# Altium footprint library tinyCLUNX33.PcbLib: 4 footprints
Each footprint in its own frame and in the unit in brackets; x right, y up, seen from the top. Pads: shape width x height; smd on the part's side, far side on the other; paste and mask are expansions set on the pad; w line width, h text height; cw(c..) or ccw(c..) is an arc to the next point about the centre after c.
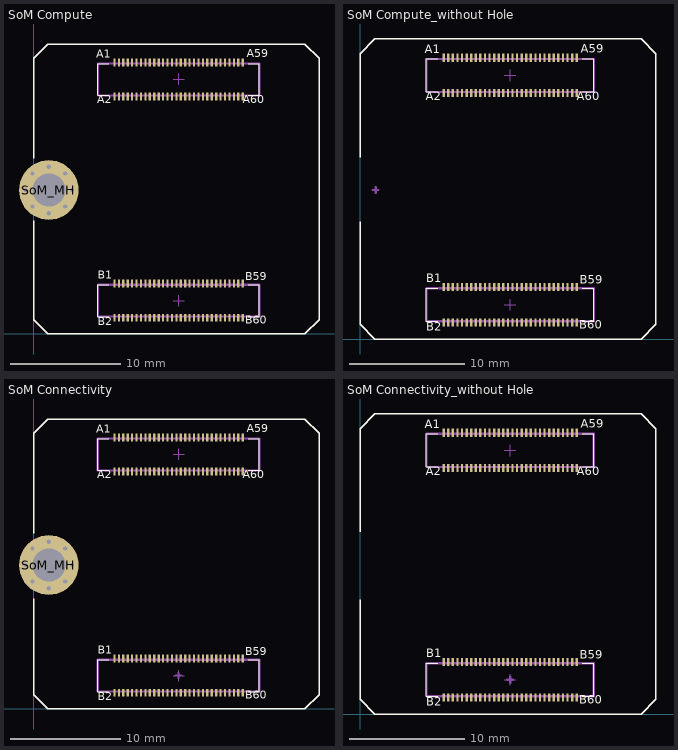
[diagram p0: the footprints below, top view; thin cyan lines are the x and y axes]

## SoM Compute [mm]
pads (121):
  rect 0.2x0.7 smd mask+0.051: A1(7.282,24.527) A2(7.282,21.447) A3(7.682,24.527) A4(7.682,21.447) A5(8.082,24.527) A6(8.082,21.447) A7(8.482,24.527) A8(8.482,21.447) A9(8.882,24.527) A10(8.882,21.447) A11(9.282,24.527) A12(9.282,21.447) A13(9.682,24.527) A14(9.682,21.447) A15(10.082,24.527) A16(10.082,21.447) A17(10.482,24.527) A18(10.482,21.447) A19(10.882,24.527) A20(10.882,21.447) A21(11.282,24.527) A22(11.282,21.447) A23(11.682,24.527) A24(11.682,21.447) A25(12.082,24.527) A26(12.082,21.447) A27(12.482,24.527) A28(12.482,21.447) A29(12.882,24.527) A30(12.882,21.447) A31(13.282,24.527) A32(13.282,21.447) A33(13.682,24.527) A34(13.682,21.447) A35(14.082,24.527) A36(14.082,21.447) A37(14.482,24.527) A38(14.482,21.447) A39(14.882,24.527) A40(14.882,21.447) A41(15.282,24.527) A42(15.282,21.447) A43(15.682,24.527) A44(15.682,21.447) A45(16.082,24.527) A46(16.082,21.447) A47(16.482,24.527) A48(16.482,21.447) A49(16.882,24.527) A50(16.882,21.447) A51(17.282,24.527) A52(17.282,21.447) A53(17.682,24.527) A54(17.682,21.447) A55(18.082,24.527) A56(18.082,21.447) A57(18.482,24.527) A58(18.482,21.447) A59(18.882,24.527) A60(18.882,21.447) B1(7.282,4.527) B2(7.282,1.447) B3(7.682,4.527) B4(7.682,1.447) B5(8.082,4.527) B6(8.082,1.447) B7(8.482,4.527) B8(8.482,1.447) B9(8.882,4.527) B10(8.882,1.447) B11(9.282,4.527) B12(9.282,1.447) B13(9.682,4.527) B14(9.682,1.447) B15(10.082,4.527) B16(10.082,1.447) B17(10.482,4.527) B18(10.482,1.447) B19(10.882,4.527) B20(10.882,1.447) B21(11.282,4.527) B22(11.282,1.447) B23(11.682,4.527) B24(11.682,1.447) B25(12.082,4.527) B26(12.082,1.447) B27(12.482,4.527) B28(12.482,1.447) B29(12.882,4.527) B30(12.882,1.447) B31(13.282,4.527) B32(13.282,1.447) B33(13.682,4.527) B34(13.682,1.447) B35(14.082,4.527) B36(14.082,1.447) B37(14.482,4.527) B38(14.482,1.447) B39(14.882,4.527) B40(14.882,1.447) B41(15.282,4.527) B42(15.282,1.447) B43(15.682,4.527) B44(15.682,1.447) B45(16.082,4.527) B46(16.082,1.447) B47(16.482,4.527) B48(16.482,1.447) B49(16.882,4.527) B50(16.882,1.447) B51(17.282,4.527) B52(17.282,1.447) B53(17.682,4.527) B54(17.682,1.447) B55(18.082,4.527) B56(18.082,1.447) B57(18.482,4.527) B58(18.482,1.447) B59(18.882,4.527) B60(18.882,1.447)
  round 5.4 hole 3: SoM_MH(1.35,12.987)
via 2.835,11.502 diameter 0.762 hole 0.381
via -0.135,11.502 diameter 0.762 hole 0.381
via 1.35,10.887 diameter 0.762 hole 0.381
via -0.135,14.472 diameter 0.762 hole 0.381
via -0.75,12.987 diameter 0.762 hole 0.381
via 1.35,15.087 diameter 0.762 hole 0.381
via 2.835,14.472 diameter 0.762 hole 0.381
via 3.45,12.987 diameter 0.762 hole 0.381
Top Overlay:
  lines w0.1: 6.782,1.547 5.782,1.547 5.782,4.427 6.782,4.427 ; 6.782,21.547 5.782,21.547 5.782,24.427 6.782,24.427 ; 19.382,1.547 20.382,1.547 20.382,4.427 19.382,4.427 ; 19.382,21.547 20.382,21.547 20.382,24.427 19.382,24.427
  lines w0.127: 0,1.27 0,10.21 ; 0,15.851 0,24.892 1.27,26.162 24.511,26.162 25.781,24.892 25.781,1.27 24.511,0 1.27,0 0.001,1.27
  text "B1" at 5.782,4.677 h1.27
  text "B2" at 5.782,0.473 h1.27
  text "B60" at 19.101,0.623 h1.27
  text "B59" at 19.126,4.562 h1.27
  text "A1" at 5.626,24.677 h1.27
  text "A2" at 5.716,20.549 h1.27
  text "A60" at 18.883,20.562 h1.27
  text "A59" at 19.229,24.704 h1.27
Mechanical 1:
  lines w0.051: 12.582,2.987 13.582,2.987 ; 12.582,22.987 13.582,22.987 ; 13.082,2.487 13.082,3.487 ; 13.082,22.487 13.082,23.487
  lines w0.2: 1.096,12.987 1.604,12.987 ; 1.35,12.733 1.35,13.241
Mechanical 13:
  lines w0.2: 5.782,1.547 5.782,4.427 20.382,4.427 20.382,1.547 5.782,1.547 ; 5.782,21.547 5.782,24.427 20.382,24.427 20.382,21.547 5.782,21.547
  text "B59" at 18.364,3.444 h1.27
  text "B60" at 18.364,1.766 h1.27
  text "B2" at 5.993,1.775 h1.27
  text "B1" at 6.017,3.403 h1.27
  text ".Designator" at 12.367,12.721 h0.3
  text "A59" at 18.238,23.434 h1.27
  text "A60" at 18.213,21.882 h1.27
  text "A2" at 6.021,21.819 h1.27
  text "A1" at 6.021,23.444 h1.27
3D body "DF40C(2.0)-60DS.stp": height 1.96, standoff 0.01, extent 5.782,1.297 20.382,4.677
3D body "DF40C(2.0)-60DS.stp": height 1.96, standoff 0.01, extent 5.782,21.297 20.382,24.677
3D body "tinyNXU_Compute v3.0.step": height 4.4, standoff 0.84, extent 0,0 25.781,26.162

## SoM Compute_without Hole [mm]
pads (120):
  rect 0.2x0.7 smd mask+0.051: A1(7.282,24.527) A2(7.282,21.447) A3(7.682,24.527) A4(7.682,21.447) A5(8.082,24.527) A6(8.082,21.447) A7(8.482,24.527) A8(8.482,21.447) A9(8.882,24.527) A10(8.882,21.447) A11(9.282,24.527) A12(9.282,21.447) A13(9.682,24.527) A14(9.682,21.447) A15(10.082,24.527) A16(10.082,21.447) A17(10.482,24.527) A18(10.482,21.447) A19(10.882,24.527) A20(10.882,21.447) A21(11.282,24.527) A22(11.282,21.447) A23(11.682,24.527) A24(11.682,21.447) A25(12.082,24.527) A26(12.082,21.447) A27(12.482,24.527) A28(12.482,21.447) A29(12.882,24.527) A30(12.882,21.447) A31(13.282,24.527) A32(13.282,21.447) A33(13.682,24.527) A34(13.682,21.447) A35(14.082,24.527) A36(14.082,21.447) A37(14.482,24.527) A38(14.482,21.447) A39(14.882,24.527) A40(14.882,21.447) A41(15.282,24.527) A42(15.282,21.447) A43(15.682,24.527) A44(15.682,21.447) A45(16.082,24.527) A46(16.082,21.447) A47(16.482,24.527) A48(16.482,21.447) A49(16.882,24.527) A50(16.882,21.447) A51(17.282,24.527) A52(17.282,21.447) A53(17.682,24.527) A54(17.682,21.447) A55(18.082,24.527) A56(18.082,21.447) A57(18.482,24.527) A58(18.482,21.447) A59(18.882,24.527) A60(18.882,21.447) B1(7.282,4.527) B2(7.282,1.447) B3(7.682,4.527) B4(7.682,1.447) B5(8.082,4.527) B6(8.082,1.447) B7(8.482,4.527) B8(8.482,1.447) B9(8.882,4.527) B10(8.882,1.447) B11(9.282,4.527) B12(9.282,1.447) B13(9.682,4.527) B14(9.682,1.447) B15(10.082,4.527) B16(10.082,1.447) B17(10.482,4.527) B18(10.482,1.447) B19(10.882,4.527) B20(10.882,1.447) B21(11.282,4.527) B22(11.282,1.447) B23(11.682,4.527) B24(11.682,1.447) B25(12.082,4.527) B26(12.082,1.447) B27(12.482,4.527) B28(12.482,1.447) B29(12.882,4.527) B30(12.882,1.447) B31(13.282,4.527) B32(13.282,1.447) B33(13.682,4.527) B34(13.682,1.447) B35(14.082,4.527) B36(14.082,1.447) B37(14.482,4.527) B38(14.482,1.447) B39(14.882,4.527) B40(14.882,1.447) B41(15.282,4.527) B42(15.282,1.447) B43(15.682,4.527) B44(15.682,1.447) B45(16.082,4.527) B46(16.082,1.447) B47(16.482,4.527) B48(16.482,1.447) B49(16.882,4.527) B50(16.882,1.447) B51(17.282,4.527) B52(17.282,1.447) B53(17.682,4.527) B54(17.682,1.447) B55(18.082,4.527) B56(18.082,1.447) B57(18.482,4.527) B58(18.482,1.447) B59(18.882,4.527) B60(18.882,1.447)
Top Overlay:
  lines w0.1: 6.782,1.547 5.782,1.547 5.782,4.427 6.782,4.427 ; 6.782,21.547 5.782,21.547 5.782,24.427 6.782,24.427 ; 19.382,1.547 20.382,1.547 20.382,4.427 19.382,4.427 ; 19.382,21.547 20.382,21.547 20.382,24.427 19.382,24.427
  lines w0.127: 0,1.27 0,10.21 ; 0,15.851 0,24.892 1.27,26.162 24.511,26.162 25.781,24.892 25.781,1.27 24.511,0 1.27,0 0.001,1.27
  text "A59" at 19.229,24.704 h1.27
  text "A60" at 18.883,20.562 h1.27
  text "A2" at 5.716,20.549 h1.27
  text "A1" at 5.626,24.677 h1.27
  text "B59" at 19.126,4.562 h1.27
  text "B60" at 19.101,0.623 h1.27
  text "B2" at 5.782,0.473 h1.27
  text "B1" at 5.782,4.677 h1.27
Mechanical 1:
  lines w0.051: 12.582,2.987 13.582,2.987 ; 12.582,22.987 13.582,22.987 ; 13.082,2.487 13.082,3.487 ; 13.082,22.487 13.082,23.487
  lines w0.2: 1.096,12.987 1.604,12.987 ; 1.35,12.733 1.35,13.241
Mechanical 13:
  lines w0.2: 5.782,1.547 20.382,1.547 20.382,4.427 5.782,4.427 5.782,1.547 ; 5.782,21.547 20.382,21.547 20.382,24.427 5.782,24.427 5.782,21.547
  text "A1" at 6.021,23.444 h1.27
  text "A2" at 6.021,21.819 h1.27
  text "A60" at 18.213,21.882 h1.27
  text "A59" at 18.238,23.434 h1.27
  text ".Designator" at 12.367,12.721 h0.3
  text "B1" at 6.017,3.403 h1.27
  text "B2" at 5.993,1.775 h1.27
  text "B60" at 18.364,1.766 h1.27
  text "B59" at 18.364,3.444 h1.27
3D body "tinyNXU_Compute v3.0.step": height 4.4, standoff 0.84, extent 0,0 25.781,26.162
3D body "DF40C(2.0)-60DS.stp": height 1.96, standoff 0.01, extent 5.782,21.297 20.382,24.677
3D body "DF40C(2.0)-60DS.stp": height 1.96, standoff 0.01, extent 5.782,1.297 20.382,4.677

## SoM Connectivity [mm]
pads (121):
  rect 0.2x0.7 smd mask+0.051: A1(7.281,24.527) A2(7.281,21.447) A3(7.681,24.527) A4(7.681,21.447) A5(8.081,24.527) A6(8.081,21.447) A7(8.481,24.527) A8(8.481,21.447) A9(8.881,24.527) A10(8.881,21.447) A11(9.281,24.527) A12(9.281,21.447) A13(9.681,24.527) A14(9.681,21.447) A15(10.081,24.527) A16(10.081,21.447) A17(10.481,24.527) A18(10.481,21.447) A19(10.881,24.527) A20(10.881,21.447) A21(11.281,24.527) A22(11.281,21.447) A23(11.681,24.527) A24(11.681,21.447) A25(12.081,24.527) A26(12.081,21.447) A27(12.481,24.527) A28(12.481,21.447) A29(12.881,24.527) A30(12.881,21.447) A31(13.281,24.527) A32(13.281,21.447) A33(13.681,24.527) A34(13.681,21.447) A35(14.081,24.527) A36(14.081,21.447) A37(14.481,24.527) A38(14.481,21.447) A39(14.881,24.527) A40(14.881,21.447) A41(15.281,24.527) A42(15.281,21.447) A43(15.681,24.527) A44(15.681,21.447) A45(16.081,24.527) A46(16.081,21.447) A47(16.481,24.527) A48(16.481,21.447) A49(16.881,24.527) A50(16.881,21.447) A51(17.281,24.527) A52(17.281,21.447) A53(17.681,24.527) A54(17.681,21.447) A55(18.081,24.527) A56(18.081,21.447) A57(18.481,24.527) A58(18.481,21.447) A59(18.881,24.527) A60(18.881,21.447) B1(7.281,4.527) B2(7.281,1.447) B3(7.681,4.527) B4(7.681,1.447) B5(8.081,4.527) B6(8.081,1.447) B7(8.481,4.527) B8(8.481,1.447) B9(8.881,4.527) B10(8.881,1.447) B11(9.281,4.527) B12(9.281,1.447) B13(9.681,4.527) B14(9.681,1.447) B15(10.081,4.527) B16(10.081,1.447) B17(10.481,4.527) B18(10.481,1.447) B19(10.881,4.527) B20(10.881,1.447) B21(11.281,4.527) B22(11.281,1.447) B23(11.681,4.527) B24(11.681,1.447) B25(12.081,4.527) B26(12.081,1.447) B27(12.481,4.527) B28(12.481,1.447) B29(12.881,4.527) B30(12.881,1.447) B31(13.281,4.527) B32(13.281,1.447) B33(13.681,4.527) B34(13.681,1.447) B35(14.081,4.527) B36(14.081,1.447) B37(14.481,4.527) B38(14.481,1.447) B39(14.881,4.527) B40(14.881,1.447) B41(15.281,4.527) B42(15.281,1.447) B43(15.681,4.527) B44(15.681,1.447) B45(16.081,4.527) B46(16.081,1.447) B47(16.481,4.527) B48(16.481,1.447) B49(16.881,4.527) B50(16.881,1.447) B51(17.281,4.527) B52(17.281,1.447) B53(17.681,4.527) B54(17.681,1.447) B55(18.081,4.527) B56(18.081,1.447) B57(18.481,4.527) B58(18.481,1.447) B59(18.881,4.527) B60(18.881,1.447)
  round 5.4 hole 3: SoM_MH(1.35,12.987)
via 2.835,11.502 diameter 0.762 hole 0.381
via -0.135,11.502 diameter 0.762 hole 0.381
via 1.35,10.887 diameter 0.762 hole 0.381
via -0.135,14.472 diameter 0.762 hole 0.381
via -0.75,12.987 diameter 0.762 hole 0.381
via 1.35,15.087 diameter 0.762 hole 0.381
via 2.835,14.472 diameter 0.762 hole 0.381
via 3.45,12.987 diameter 0.762 hole 0.381
Top Overlay:
  lines w0.1: 6.781,1.547 5.781,1.547 5.781,4.427 6.781,4.427 ; 6.781,21.547 5.781,21.547 5.781,24.427 6.781,24.427 ; 19.381,1.547 20.381,1.547 20.381,4.427 19.381,4.427 ; 19.381,21.547 20.381,21.547 20.381,24.427 19.381,24.427
  lines w0.127: 0,1.27 0,9.96 ; 0,15.879 0,24.892 1.27,26.162 24.511,26.162 25.781,24.892 25.781,1.27 24.511,0 1.27,0 0.001,1.27
  text "B1" at 5.781,4.677 h1.27
  text "B2" at 5.781,0.473 h1.27
  text "B60" at 19.1,0.623 h1.27
  text "B59" at 19.126,4.562 h1.27
  text "A2" at 5.716,20.549 h1.27
  text "A60" at 18.882,20.562 h1.27
  text "A1" at 5.626,24.677 h1.27
  text "A59" at 19.229,24.704 h1.27
Mechanical 1:
  lines w0.051: 12.581,2.987 13.581,2.987 ; 12.581,22.987 13.581,22.987 ; 13.081,2.487 13.081,3.487 ; 13.081,22.487 13.081,23.487
  lines w0.2: 12.827,2.987 13.335,2.987 ; 13.081,2.733 13.081,3.241
Mechanical 13:
  lines w0.2: 5.781,1.547 5.781,4.427 20.381,4.427 20.381,1.547 5.781,1.547 ; 5.781,21.547 20.381,21.547 20.381,24.427 5.781,24.427 5.781,21.547
  text "B59" at 18.364,3.444 h1.27
  text "B60" at 18.364,1.766 h1.27
  text "B2" at 5.992,1.776 h1.27
  text "B1" at 6.017,3.403 h1.27
  text "A2" at 6.021,21.819 h1.27
  text "A60" at 18.213,21.882 h1.27
  text "A59" at 18.238,23.434 h1.27
  text "A1" at 6.021,23.444 h1.27
  text ".Designator" at 12.367,12.721 h0.3
3D body "DF40C(2.0)-60DS.stp": height 1.96, standoff 0.01, extent 5.781,1.297 20.381,4.677
3D body "DF40C(2.0)-60DS.stp": height 1.96, standoff 0.01, extent 5.781,21.297 20.381,24.677
3D body "tinyCLUNX33-B v3.0.step": height 4.4, standoff 0.84, extent 0,-0.001 25.781,26.162

## SoM Connectivity_without Hole [mm]
pads (120):
  rect 0.2x0.7 smd mask+0.051: A1(7.281,24.527) A2(7.281,21.447) A3(7.681,24.527) A4(7.681,21.447) A5(8.081,24.527) A6(8.081,21.447) A7(8.481,24.527) A8(8.481,21.447) A9(8.881,24.527) A10(8.881,21.447) A11(9.281,24.527) A12(9.281,21.447) A13(9.681,24.527) A14(9.681,21.447) A15(10.081,24.527) A16(10.081,21.447) A17(10.481,24.527) A18(10.481,21.447) A19(10.881,24.527) A20(10.881,21.447) A21(11.281,24.527) A22(11.281,21.447) A23(11.681,24.527) A24(11.681,21.447) A25(12.081,24.527) A26(12.081,21.447) A27(12.481,24.527) A28(12.481,21.447) A29(12.881,24.527) A30(12.881,21.447) A31(13.281,24.527) A32(13.281,21.447) A33(13.681,24.527) A34(13.681,21.447) A35(14.081,24.527) A36(14.081,21.447) A37(14.481,24.527) A38(14.481,21.447) A39(14.881,24.527) A40(14.881,21.447) A41(15.281,24.527) A42(15.281,21.447) A43(15.681,24.527) A44(15.681,21.447) A45(16.081,24.527) A46(16.081,21.447) A47(16.481,24.527) A48(16.481,21.447) A49(16.881,24.527) A50(16.881,21.447) A51(17.281,24.527) A52(17.281,21.447) A53(17.681,24.527) A54(17.681,21.447) A55(18.081,24.527) A56(18.081,21.447) A57(18.481,24.527) A58(18.481,21.447) A59(18.881,24.527) A60(18.881,21.447) B1(7.281,4.527) B2(7.281,1.447) B3(7.681,4.527) B4(7.681,1.447) B5(8.081,4.527) B6(8.081,1.447) B7(8.481,4.527) B8(8.481,1.447) B9(8.881,4.527) B10(8.881,1.447) B11(9.281,4.527) B12(9.281,1.447) B13(9.681,4.527) B14(9.681,1.447) B15(10.081,4.527) B16(10.081,1.447) B17(10.481,4.527) B18(10.481,1.447) B19(10.881,4.527) B20(10.881,1.447) B21(11.281,4.527) B22(11.281,1.447) B23(11.681,4.527) B24(11.681,1.447) B25(12.081,4.527) B26(12.081,1.447) B27(12.481,4.527) B28(12.481,1.447) B29(12.881,4.527) B30(12.881,1.447) B31(13.281,4.527) B32(13.281,1.447) B33(13.681,4.527) B34(13.681,1.447) B35(14.081,4.527) B36(14.081,1.447) B37(14.481,4.527) B38(14.481,1.447) B39(14.881,4.527) B40(14.881,1.447) B41(15.281,4.527) B42(15.281,1.447) B43(15.681,4.527) B44(15.681,1.447) B45(16.081,4.527) B46(16.081,1.447) B47(16.481,4.527) B48(16.481,1.447) B49(16.881,4.527) B50(16.881,1.447) B51(17.281,4.527) B52(17.281,1.447) B53(17.681,4.527) B54(17.681,1.447) B55(18.081,4.527) B56(18.081,1.447) B57(18.481,4.527) B58(18.481,1.447) B59(18.881,4.527) B60(18.881,1.447)
Top Overlay:
  lines w0.1: 6.781,1.547 5.781,1.547 5.781,4.427 6.781,4.427 ; 6.781,21.547 5.781,21.547 5.781,24.427 6.781,24.427 ; 19.381,1.547 20.381,1.547 20.381,4.427 19.381,4.427 ; 19.381,21.547 20.381,21.547 20.381,24.427 19.381,24.427
  lines w0.127: 0,1.27 0,9.96 ; 0,15.879 0,24.892 1.27,26.162 24.511,26.162 25.781,24.892 25.781,1.27 24.511,0 1.27,0 0.001,1.27
  text "A59" at 19.229,24.704 h1.27
  text "A1" at 5.626,24.677 h1.27
  text "A60" at 18.882,20.562 h1.27
  text "A2" at 5.716,20.549 h1.27
  text "B59" at 19.126,4.562 h1.27
  text "B60" at 19.1,0.623 h1.27
  text "B2" at 5.781,0.473 h1.27
  text "B1" at 5.781,4.677 h1.27
Mechanical 1:
  lines w0.051: 12.581,2.987 13.581,2.987 ; 12.581,22.987 13.581,22.987 ; 13.081,2.487 13.081,3.487 ; 13.081,22.487 13.081,23.487
  lines w0.2: 12.827,2.987 13.335,2.987 ; 13.081,2.733 13.081,3.241
Mechanical 13:
  lines w0.2: 5.781,1.547 20.381,1.547 20.381,4.427 5.781,4.427 5.781,1.547 ; 5.781,21.547 5.781,24.427 20.381,24.427 20.381,21.547 5.781,21.547
  text ".Designator" at 12.367,12.721 h0.3
  text "A1" at 6.021,23.444 h1.27
  text "A59" at 18.238,23.434 h1.27
  text "A60" at 18.213,21.882 h1.27
  text "A2" at 6.021,21.819 h1.27
  text "B1" at 6.017,3.403 h1.27
  text "B2" at 5.992,1.776 h1.27
  text "B60" at 18.364,1.766 h1.27
  text "B59" at 18.364,3.444 h1.27
3D body "tinyCLUNX33-B v3.0.step": height 4.4, standoff 0.84, extent 0,-0.001 25.781,26.162
3D body "DF40C(2.0)-60DS.stp": height 1.96, standoff 0.01, extent 5.781,21.297 20.381,24.677
3D body "DF40C(2.0)-60DS.stp": height 1.96, standoff 0.01, extent 5.781,1.297 20.381,4.677